# Altium footprint library PcbLib1.PcbLib: 26 footprints (part 2 of 2)
Each footprint in its own frame and in the unit in brackets; x right, y up, seen from the top. Pads: shape width x height; smd on the part's side, far side on the other; paste and mask are expansions set on the pad; w line width, h text height; cw(c..) or ccw(c..) is an arc to the next point about the centre after c.
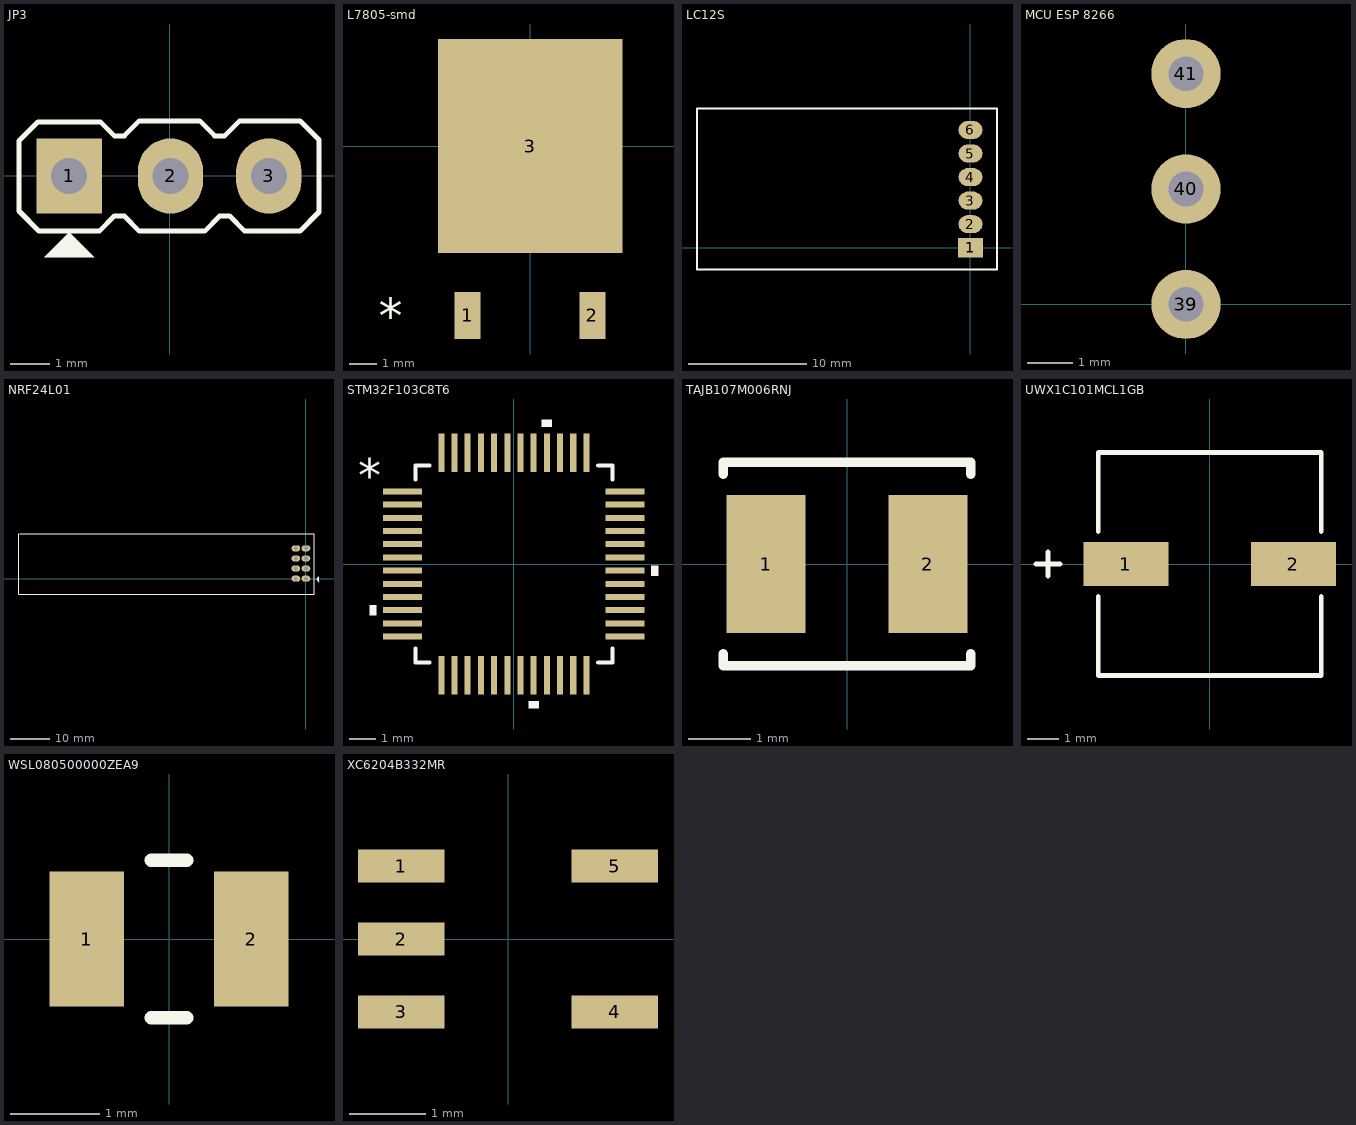
[diagram p1: the footprints below, top view; thin cyan lines are the x and y axes]

## JP3 [mil] "Jumper 3"
height 200
pads (3):
  rect 65x75 hole 36: 1(-100,0)
  oval 65x75 hole 36: 2(1,0) 3(99,0)
Top Overlay:
  region: -100,-56 -125,-81 -75,-81
  lines w5: -150,-35 -150,35 -131,54 -69,54 -55,40 -45,40 -30,55 30,55 45,40 55,40 70,55 130,55 149,36 149,-36 130,-55 75,-55 60,-40 50,-40 35,-55 -30,-55 -45,-40 -55,-40 -70,-55 -130,-55 -150,-35
3D body "User Library-PinHeaderX3.STEP": height 355.04, standoff -124.88, extent -150,-59.96 150,55

## L7805-smd [mil]
pads (3):
  rect 37x67 smd paste+0 mask+0: 1(-88.58,-240.5) 2(88.58,-240.5)
  rect 262x304 smd paste+0 mask+0: 3(0,0)
Top Overlay:
  text "*" at -214.67,-265.5 h50
3D body "DPAK_STM.step": height 95.12, standoff -2.01, extent -130,-252 130,93.11

## LC12S [mil]
pads (6):
  rect 85x65 smd: 1(0,0)
  oval 80x60 smd: 2(0,78.74) 3(0,157.48) 4(0,236.22) 5(0,314.96) 6(0,393.7)
Top Overlay:
  lines w7: -914.49,-73.3 88.74,-73.3 88.74,466.08 -914.49,466.08 -914.49,-73.3
3D body: height 78.74, standoff 0, extent -157.48,-236.22 -157.48,-236.22
3D body "LC12S.STEP": height 86.61, standoff 7.87, extent -914.49,-73.3 2.84,466.08

## MCU ESP 8266 [mil]
pads (3):
  round 60 hole 30: 39(0,0) 40(0,100) 41(0,200)
3D body "Esp8266 Node MCU.STEP": height 464.88, standoff -52.83, extent -50.82,-245 970.83,1680.2

## NRF24L01 [mil]
pads (8):
  oval 86x60 hole 36: 1(0,0) 2(-100,0) 3(0,100) 4(-100,100) 5(0,200) 6(-100,200) 7(0,300) 8(-100,300)
Top Overlay:
  lines w10: -2840,445 -2840,-152 78.8,-152 82,-155.2 82,445.2 -2831.39,445.2 ; 107,-7 107,-5 129,17 129,-29 107,-7
3D body "NRF24l01_with_antenna.STEP": height 3830.96, standoff -54.41, extent -2831.39,-155.2 82,445.2

## STM32F103C8T6 [mil]
pads (48):
  rect 58x9 smd paste+0 mask+0: 1(-166,108.27) 2(-166,88.58) 3(-166,68.9) 4(-166,49.21) 5(-166,29.53) 6(-166,9.84) 7(-166,-9.84) 8(-166,-29.53) 9(-166,-49.21) 10(-166,-68.9) 11(-166,-88.58) 12(-166,-108.27) 25(166,-108.27) 26(166,-88.58) 27(166,-68.9) 28(166,-49.21) 29(166,-29.53) 30(166,-9.84) 31(166,9.84) 32(166,29.53) 33(166,49.21) 34(166,68.9) 35(166,88.58) 36(166,108.27)
  rect 9x58 smd paste+0 mask+0: 13(-108.27,-166) 14(-88.58,-166) 15(-68.9,-166) 16(-49.21,-166) 17(-29.53,-166) 18(-9.84,-166) 19(9.84,-166) 20(29.53,-166) 21(49.21,-166) 22(68.9,-166) 23(88.58,-166) 24(108.27,-166) 37(108.27,166) 38(88.58,166) 39(68.9,166) 40(49.21,166) 41(29.53,166) 42(9.84,166) 43(-9.84,166) 44(-29.53,166) 45(-49.21,166) 46(-68.9,166) 47(-88.58,166) 48(-108.27,166)
Top Overlay:
  region: 56.71,205 41.71,205 41.71,215 56.71,215
  region: 205,-2.34 215,-2.34 215,-17.34 205,-17.34
  region: 37.03,-205 22.03,-205 22.03,-215 37.03,-215
  region: -205,-61.4 -215,-61.4 -215,-76.4 -205,-76.4
  lines w6: -147,-125.87 -147,-147 -125.87,-147 ; -147,125.87 -147,147 -125.87,147 ; 125.87,-147 147,-147 147,-125.87 ; 125.87,147 147,147 147,125.87
  text "*" at -232.5,108.11 h50
3D body "LQFP-48_STM.step": height 63.11, standoff 0, extent -179.98,-181.98 181.99,179.99
3D body: height 10, standoff 0, extent 0,0 10,10

## TAJB107M006RNJ [mil]
pads (2):
  rect 49.98x87 smd paste+0 mask+0: 1(-51.01,0) 2(51.01,0)
Top Overlay:
  lines w6: -78,-56.45 -78,-64 78,-64 78,-56.45 ; -78,56.45 -78,64 78,64 78,56.45
3D body "TAJB_AVX.step": height 85, standoff 0, extent -72.98,-59.01 73,59.02

## UWX1C101MCL1GB [mil]
pads (2):
  rect 106x55 smd paste+0 mask+0: 1(-104.5,0) 2(104.5,0)
Top Overlay:
  lines w6: -216.5,0 -186.5,0 ; -201.5,-15 -201.5,15 ; -139,-40.6 -139,-139 139,-139 139,-40.6 ; -139,40.6 -139,139 139,139 139,40.6
3D body "PCAP_6_3x5_4-ELECT_NCA.step": height 219.09, standoff 0, extent -145,-134.02 146.02,134.02
3D body: height 10, standoff 0, extent 0,0 10,10

## WSL080500000ZEA9 [mil]
pads (2):
  rect 33x60 smd: 1(-36.5,0) 2(36.5,0)
Top Overlay:
  lines w6: -7.89,-35 7.89,-35 ; -7.89,35 7.89,35
3D body: height 10, standoff 0, extent 0,0 10,10
3D body "RES_0805_WSL.step": height 17.99, standoff 0, extent -45,-30 45,30

## XC6204B332MR [mil]
pads (5):
  rect 44.5x17 smd paste+0 mask+0: 1(-54.75,37.4) 2(-54.75,0) 3(-54.75,-37.4) 4(54.75,-37.4) 5(54.75,37.4)
3D body "XC620405_SOT-25_TOR.step": height 51.1, standoff 0, extent -55,-57 55,57.02